# Altium schematic symbol library SCHLIB.SchLib: 2608 symbols (part 10 of 20) (continued)
## LED-WHITE-2PLCC (continued)
LED COOL WHITE DIFF 2PLCC SMD; Manufacturer: Cree; Manufacturer Part Number: CLM3C-WKW-CWBYA453; Lens Color: Yellow; Viewing Angle: 120°; Lens Style: Elliptical,Flat,Diffused,Rectangular; Forward Current: 20mA; Luminous Intensity: 1850mcd; Lens Transparency: Diffused; Luminous Flux: 4.2lm; Number of Elements: 1; Power Dissipation: 100mW; Correlated Color Temperature (CCT): 5500K; Reverse Voltage: 5V; Washability: OK; Supplier 1: Mouser; Stock 1: 33525; Pricing 1: 1=0,21000, 10=0,19600, 100=0,17900, 1000=0,16200, 2500=0,16200, 10000=0,15700 (USD); RoHS: Yes; Mount: Surface Mount; Case/Package: SMD/SMT; Number of Pins: 2; Color: White; Min Operating Temperature: -40°C; Max Operating Temperature: 100°C; Packaging: Tape and Reel; Package Quantity: 1; Illumination Color: White; Test Current: 20mA; Number of LEDs: 1; Length: 2.7mm; Height: 1.4mm; Width: 2mm; Depth: 2mm; Radiation Hardening: No; REACH SVHC: Unknown; ComponentLink1URL: https://datasheet.ciiva.com/1244/1825749-1244305.pdf?src-supplier=Element14; ComponentLink1Description: https://datasheet.ciiva.com/1244/1825749-1244305.pdf?src-supplier=Element14; ComponentLink2URL: https://datasheet.ciiva.com/2111/clm3c1076-2111265.pdf?src-supplier=Digi-Key; ComponentLink2Description: https://datasheet.ciiva.com/2111/clm3c1076-2111265.pdf?src-supplier=Digi-Key; ComponentLink3URL: https://datasheet.ciiva.com/2111/clm3c1076-2111266.pdf?src-supplier=Digi-Key; ComponentLink3Description: https://datasheet.ciiva.com/2111/clm3c1076-2111266.pdf?src-supplier=Digi-Key; ComponentLink4URL: https://datasheet.ciiva.com/2111/clm3c1076-2111267.pdf?src-supplier=Digi-Key; ComponentLink4Description: https://datasheet.ciiva.com/2111/clm3c1076-2111267.pdf?src-supplier=Digi-Key; ComponentLink5URL: https://datasheet.ciiva.com/15210/getdatasheetpartid-351108-15210359.pdf?src-supplier=Verical; ComponentLink5Description: https://datasheet.ciiva.com/15210/getdatasheetpartid-351108-15210359.pdf?src-supplier=Verical; Supplier Part Number 1: 941-CLM3CWKWCWBYA453
footprint LED-2PLCC-CLM3C-WKW/WKW
pins: A, C

## LED-WHITE-0805
designator D?, comment APTK2012RWC  Forward Voltage: 3.2V  Case/Package: 0805
LED WHITE CLEAR 0805 SMD; Manufacturer: Kingbright; Manufacturer Part Number: APTK2012RWC/Z-F01; Lens Colour: Colorless; Viewing Angle: 100°; Luminous Intensity: 700mcd; Test Current: 20mA; Washability: OK; Supplier 1: Digi-Key; Supplier Part Number 1: APTK2012RWC/Z-F01-ND; Stock 1: 0; Mount: Surface Mount; Colour: White; Package Quantity: 2000; Packaging: Tape and Reel; Lens Transparency: Clear; Length: 2mm; Height: 0.75mm; Width: 1.25mm
footprint LED-0805-WHITE
pins: A, C

## LED-WHITE-RA
designator LED?, comment Forward Voltage: 3.1V  (hidden comment: LTW-006DCG-E2)
LED WHITE SMD R/A; Manufacturer: Vishay Lite-On; Lens Color: Yellow; Viewing Angle: 110°; Luminous Intensity: 2100mcd; Test Current: 20mA; Lens Style: Colored; Forward Current: 30mA; Reverse Voltage: 5V; Number of Elements: 1; Power Dissipation: 120mW; Supplier 1: Digi-Key; Supplier Part Number 1: 160-1870-1-ND; Manufacturer Part Number: LTW-006DCG-E2; Stock: 850; Pricing: 1=0.44, 10=0.316, 100=0.2064, 500=0.1484, 1000=0.1161 (USD); RoHS: Yes; Mount: Surface Mount; Case/Package: SMD/SMT; Number of Pins: 2; Color: White; Min Operating Temperature: -30°C; Max Operating Temperature: 85°C; Packaging: Tape and Reel; Package Quantity: 1; Length: 3.8mm; Height: 0.6mm; Width: 1.2mm; Depth: 1.2mm; Lead Free: Lead Free; ComponentLink1URL: https://datasheet.ciiva.com/2116/ltw-006dcg-e2-2116066.pdf?src-supplier=Digi-Key; ComponentLink1Description: https://datasheet.ciiva.com/2116/ltw-006dcg-e2-2116066.pdf?src-supplier=Digi-Key; ComponentLink2URL: https://datasheet.ciiva.com/2116/ltw-006dcg-e2-2116067.pdf?src-supplier=Digi-Key; ComponentLink2Description: https://datasheet.ciiva.com/2116/ltw-006dcg-e2-2116067.pdf?src-supplier=Digi-Key; ComponentLink3URL: https://datasheet.ciiva.com/2116/ltw-006dcg-e2-2116065.pdf?src-supplier=Digi-Key; ComponentLink3Description: https://datasheet.ciiva.com/2116/ltw-006dcg-e2-2116065.pdf?src-supplier=Digi-Key
footprint LED-RA-2-SMD
pins: A 1, C 2

## LED-WHITE-TH-3MM
designator D?, comment RED  Forward Voltage: 2V
LED RED CLEAR 3MM ROUND T/H; Manufacturer 1: Wurth Electronics; Manufacturer Part Number 1: 151033RS03000; Luminous Intensity: 2600mcd; Viewing Angle: 30°; Lens Style: Clear,Circular,Round; Wavelength: 621nm; Test Current: 20mA; Forward Current: 30mA; Washability: OK; Supplier 1: Digi-Key; Stock 1: 20081; Pricing 1: 1=0,17000, 50=0,15700, 100=0,13400, 500=0,11500 (USD); RoHS: Yes; Mount: Through Hole; Case/Package: Radial; Color: Red; Min Operating Temperature: -40°C; Max Operating Temperature: 85°C; Package Quantity: 1; Packaging: Bulk; Dominant Wavelength: 621nm; Height: 5.55mm; Lens Size: 3mm; REACH SVHC: Unknown; ComponentLink1URL: https://datasheet.ciiva.com/22657/151033rs03000-22657026.pdf?src-supplier=Element14; ComponentLink1Description: https://datasheet.ciiva.com/22657/151033rs03000-22657026.pdf?src-supplier=Element14; ComponentLink2URL: https://datasheet.ciiva.com/29335/759472-da-01-en-tht-led-3mm-rot-151033rs03000-29335425.pdf?src-supplier=Conrad; ComponentLink2Description: https://datasheet.ciiva.com/29335/759472-da-01-en-tht-led-3mm-rot-151033rs03000-29335425.pdf?src-supplier=Conrad; ComponentLink3URL: https://datasheet.ciiva.com/48429/151033rs03000-eng-tds-48429974.pdf?src-supplier=Distrelec; ComponentLink3Description: https://datasheet.ciiva.com/48429/151033rs03000-eng-tds-48429974.pdf?src-supplier=Distrelec; Supplier Part Number 1: 732-5013-ND
footprint LED_RED_3MM
pins: A, C

## LED-WHITE-TH-5MM
designator D?, comment Forward Voltage: 3.2V  Case/Package: TH  (hidden comment: WHITE)
LED WHITE 5MM ROUND T/H; Manufacturer: Everlight; Manufacturer Part Number: 334-15/X1C5-1QSA; Lens Colour: Colorless; Lens Style: Circular,Colorless,Diffused; Viewing Angle: 50°; Luminous Intensity: 5375mcd; Test Current: 20mA; Lens Transparency: Clear; Correlated Colour Temperature (CCT): x=0.4/y=0.39; Number of LEDs: 1; Washability: OK; Supplier 1: Digi-Key; Stock 1: 6042; Pricing 1: 1=0.7, 10=0.543, 25=0.4496, 100=0.3875, 250=0.341, 500=0.2945, 1000=0.2325, 2500=0.217, 5000=0.20925 (USD); Mount: Through Hole; Number of Pins: 2; Colour: White; Packaging: Bulk; Package Quantity: 500; Height: 8.9mm; Radiation Hardening: No; ComponentLink1URL: //media.digikey.com/PDF/Data%20Sheets/Everlight%20PDFs/1246342150_6815.pdf; ComponentLink1Description: //media.digikey.com/PDF/Data%20Sheets/Everlight%20PDFs/1246342150_6815.pdf; Supplier Part Number 1: 1080-1008-ND; Supplier 2: Digi-Key; Stock 2: 21231; Pricing 2: 1=0.71, 10=0.551, 25=0.4568, 100=0.3938, 250=0.34652, 500=0.29926, 1000=0.23625, 2500=0.2205, 5000=0.21263 (USD); Supplier Part Number 2: 1080-1007-ND; Supplier 3: Digi-Key; Stock 3: 8962; Pricing 3: 1=0.22, 10=0.207, 100=0.1911, 1000=0.17092 (USD); Min Operating Temperature: -40°C; Max Operating Temperature: 95°C; Illumination Colour: White; Forward Current: 20mA; ComponentLink2URL: http://www.mouser.com/ds/2/90/C512A%20WNS%20WNN%20942-474940.pdf; ComponentLink2Description: http://www.mouser.com/ds/2/90/C512A%20WNS%20WNN%20942-474940.pdf; ComponentLink3URL: http://www.cree.com/~/media/Files/Cree/LED%20Components%20and%20Modules/HB/Data%20Sheets/C512A%20WNS%20WNN%20942.pdf; ComponentLink3Description: http://www.cree.com/~/media/Files/Cree/LED%20Components%20and%20Modules/HB/Data%20Sheets/C512A%20WNS%20WNN%20942.pdf; Supplier Part Number 3: C512A-WNN-CZ0B0152CT-ND
footprint LED_WHITE_5MM
pins: 1, 2

## LED-YELLOW-1206
designator D?, comment APT3216SYCK  Forward Voltage: 2V
LED YELLOW CLEAR CHIP SMD; Manufacturer: Kingbright; Forward Current: 20mA; Power Rating: 75mW; Luminous Intensity: 150mcd; Viewing Angle: 120°; Lens Style: Clear,Flat; Dominant Wavelength: 590nm; Number of LEDs: 1; Washability: OK; ComponentLink1URL: http://www.kingbrightusa.com/images/catalog/SPEC/APT3216SYCK.pdf; ComponentLink1Description: http://www.kingbrightusa.com/images/catalog/SPEC/APT3216SYCK.pdf; ComponentLink2URL: http://www.mouser.com/ds/2/216/APT3216SYCK-231036.pdf; ComponentLink2Description: http://www.mouser.com/ds/2/216/APT3216SYCK-231036.pdf; ComponentLink3URL: http://www.us.kingbright.com/images/catalog/SPEC/APT3216SYCK.pdf; ComponentLink3Description: http://www.us.kingbright.com/images/catalog/SPEC/APT3216SYCK.pdf; ComponentLink4URL: http://www.mouser.com/ds/2/239/Lite-On-LTST-C230KSKT-190176.pdf; ComponentLink4Description: http://www.mouser.com/ds/2/239/Lite-On-LTST-C230KSKT-190176.pdf; ComponentLink5URL: https://www.verical.com/server-webapp/html/getDatasheet?partID=102787; ComponentLink5Description: https://www.verical.com/server-webapp/html/getDatasheet?partID=102787; ComponentLink6URL: https://media.digikey.com/pdf/Data%20Sheets/Lite-On%20PDFs/LTST-C230KSKT.pdf; ComponentLink6Description: https://media.digikey.com/pdf/Data%20Sheets/Lite-On%20PDFs/LTST-C230KSKT.pdf; ComponentLink7URL: http://www1.futureelectronics.com/doc/LITE-ON/LTST-C230KSKT.pdf; ComponentLink7Description: http://www1.futureelectronics.com/doc/LITE-ON/LTST-C230KSKT.pdf; ComponentLink8URL: http://www.mouser.com/ds/2/216/APTR3216SYCK-230901.pdf; ComponentLink8Description: http://www.mouser.com/ds/2/216/APTR3216SYCK-230901.pdf; ComponentLink9URL: http://www.us.kingbright.com/images/catalog/SPEC/APTR3216SYCK.pdf; ComponentLink9Description: http://www.us.kingbright.com/images/catalog/SPEC/APTR3216SYCK.pdf; ComponentLink10URL: http://www.kingbrightusa.com/images/catalog/SPEC/APTR3216SYCK.pdf; ComponentLink10Description: http://www.kingbrightusa.com/images/catalog/SPEC/APTR3216SYCK.pdf; Supplier 1: Digi-Key; Supplier Part Number 1: 754-1144-6-ND; Stock 1: 475; Pricing 1: 1=0.48, 10=0.347, 25=0.2656, 100=0.1733, 250=0.12704, 500=0.1078, 1000=0.08855 (USD); Mount: Surface Mount; Case/Package: 1206; Number of Pins: 2; Color: Yellow; Case Code (Metric): 3216; Case Code (Imperial): 1206; Lens Color: Clear; Min Operating Temperature: -40°C; Max Operating Temperature: 85°C; Illumination Color: Yellow; Packaging: Tape and Reel; Package Quantity: 2000; Test Current: 20mA; Wavelength: 590nm; Length: 3.2mm; Height: 0.75mm; Width: 1.6mm; Lead Free: Lead Free; Manufacturer Part Number: APT3216SYCK
footprint LED-1206-YELLOW
pins: A, C

## LED-YELLOW-1206 BE
designator D?, comment LTST-C230KSKT  Forward Voltage: 2V  Case Code (Imperial): 1206 BE
LED YELLOW CLEAR CHIP SMD BOTTOM ENTRY; Manufacturer: Vishay Lite-On; Lens Colour: Clear,Colorless; Forward Current: 30mA; Power Rating: 75mW; Luminous Intensity: 60mcd; Viewing Angle: 130°; Lens Style: Clear,Colorless,Diffused,Rectangular; Dominant Wavelength: 587nm; Test Current: 20mA; Number of Elements: 1; Wavelength: 588nm; Reverse Voltage: 5V; Washability: OK; ComponentLink1URL: http://www.kingbrightusa.com/images/catalog/SPEC/APT3216SYCK.pdf; ComponentLink1Description: http://www.kingbrightusa.com/images/catalog/SPEC/APT3216SYCK.pdf; ComponentLink2URL: http://www.mouser.com/ds/2/216/APT3216SYCK-231036.pdf; ComponentLink2Description: http://www.mouser.com/ds/2/216/APT3216SYCK-231036.pdf; ComponentLink3URL: http://www.us.kingbright.com/images/catalog/SPEC/APT3216SYCK.pdf; ComponentLink3Description: http://www.us.kingbright.com/images/catalog/SPEC/APT3216SYCK.pdf; Supplier 1: Digi-Key; Supplier Part Number 1: 160-1458-6-ND; Manufacturer Part Number: LTST-C230KSKT; Stock 1: 69522; Pricing 1: 1=0.38, 10=0.281, 25=0.2072, 100=0.148, 250=0.1006, 500=0.08878, 1000=0.06954 (USD); Mount: Surface Mount; Case/Package: 1206; Number of Pins: 2; Colour: Yellow; Case Code (Metric): 3216; Min Operating Temperature: -55°C; Max Operating Temperature: 85°C; Package Quantity: 1; Illumination Colour: Yellow; Packaging: Tape and Reel; Lens Transparency: Clear; Power Dissipation: 75mW; Number of LEDs: 1; Length: 3.2mm; Height: 1.1mm; Width: 1.6mm; Depth: 1.6mm; Radiation Hardening: No; Lead Free: Lead Free; ComponentLink4URL: http://www.mouser.com/ds/2/239/Lite-On-LTST-C230KSKT-190176.pdf; ComponentLink4Description: http://www.mouser.com/ds/2/239/Lite-On-LTST-C230KSKT-190176.pdf; ComponentLink5URL: https://www.verical.com/server-webapp/html/getDatasheet?partID=102787; ComponentLink5Description: https://www.verical.com/server-webapp/html/getDatasheet?partID=102787; ComponentLink6URL: https://media.digikey.com/pdf/Data%20Sheets/Lite-On%20PDFs/LTST-C230KSKT.pdf; ComponentLink6Description: https://media.digikey.com/pdf/Data%20Sheets/Lite-On%20PDFs/LTST-C230KSKT.pdf; ComponentLink7URL: http://www1.futureelectronics.com/doc/LITE-ON/LTST-C230KSKT.pdf; ComponentLink7Description: http://www1.futureelectronics.com/doc/LITE-ON/LTST-C230KSKT.pdf; Supplier 2: Digi-Key; Supplier Part Number 2: 754-1174-6-ND; Stock 2: 110251; Pricing 2: 1=0.48, 10=0.347, 25=0.2656, 100=0.1733, 250=0.12704, 500=0.1078, 1000=0.08855 (USD); ComponentLink8URL: http://www.mouser.com/ds/2/216/APTR3216SYCK-230901.pdf; ComponentLink8Description: http://www.mouser.com/ds/2/216/APTR3216SYCK-230901.pdf; ComponentLink9URL: http://www.us.kingbright.com/images/catalog/SPEC/APTR3216SYCK.pdf; ComponentLink9Description: http://www.us.kingbright.com/images/catalog/SPEC/APTR3216SYCK.pdf; ComponentLink10URL: http://www.kingbrightusa.com/images/catalog/SPEC/APTR3216SYCK.pdf; ComponentLink10Description: http://www.kingbrightusa.com/images/catalog/SPEC/APTR3216SYCK.pdf
footprint LED-BE-1206-V1
pins: A, C

## LED-YELLOW-1206_1
designator D?, comment LTST-C150KSKT  Voltage - Forward (Vf) (Typ): 2.1V  Case Code (Imperial): 1206
LED YELLOW CLEAR 1206 SMD; Manufacturer: Vishay Lite-On; Lens Color: Clear,Colorless; Viewing Angle: 130°; Forward Voltage: 2.4V; Luminous Intensity: 60mcd; Test Current: 20mA; Dominant Wavelength: 587nm; Wavelength: 588nm; Lens Style: Clear,Colorless,Diffused,Rectangular; Forward Current: 30mA; Power Rating: 75mW; Number of Elements: 1; Reverse Voltage: 5V; Washability: OK; Supplier 1: Digi-Key; Manufacturer Part Number: LTST-C150KSKT; Stock 1: 296465; Pricing 1: 1=0.38, 10=0.281, 25=0.2072, 100=0.148, 250=0.1006, 500=0.08878, 1000=0.06954 (USD); Mount: Surface Mount; Case/Package: 1206; Number of Pins: 2; Color: Yellow; Case Code (Metric): 3216; Min Operating Temperature: -55°C; Max Operating Temperature: 85°C; Packaging: Tape and Reel; Package Quantity: 1; Lens Transparency: Clear; Illumination Color: Yellow; Power Dissipation: 75mW; Number of LEDs: 1; Length: 3.2mm; Height: 1.1mm; Width: 1.6mm; Depth: 1.6mm; Radiation Hardening: No; Lead Free: Lead Free; ComponentLink1URL: http://www.jameco.com/Jameco/Products/ProdDS/1260226.pdf?src-supplier=Jameco; ComponentLink1Description: http://www.jameco.com/Jameco/Products/ProdDS/1260226.pdf?src-supplier=Jameco; ComponentLink2URL: http://www1.futureelectronics.com/doc/LITE-ON/LTST-C150KSKT.pdf?src-supplier=Future+Electronics; ComponentLink2Description: http://www1.futureelectronics.com/doc/LITE-ON/LTST-C150KSKT.pdf?src-supplier=Future+Electronics; ComponentLink3URL: http://components.arrow.com/part/dataview/16627581S8439237N1331?src-supplier=Arrow; ComponentLink3Description: http://components.arrow.com/part/dataview/16627581S8439237N1331?src-supplier=Arrow; ComponentLink4URL: http://www.mouser.com/ds/2/239/Lite-On-LTST-C150KSKT-187236.pdf?src-supplier=Mouser; ComponentLink4Description: http://www.mouser.com/ds/2/239/Lite-On-LTST-C150KSKT-187236.pdf?src-supplier=Mouser; ComponentLink5URL: http://optoelectronics.liteon.com/upload/download/DS-22-99-0187/LTST-C150KSKT.pdf?src-supplier=Digi-Key; ComponentLink5Description: http://optoelectronics.liteon.com/upload/download/DS-22-99-0187/LTST-C150KSKT.pdf?src-supplier=Digi-Key; Supplier Part Number 1: 160-1406-6-ND
footprint LED-1206-YELLOW
pins: A, C

## MD-UG IC ETHERCAT
designator MD?, comment ETHERCAT
UNIGATE® IC - EtherCAT®; ComponentLink1Description: Datasheet; ComponentLink1URL: https://www.deutschmann.de/en/products/embedded-solutions/unigate-ic/unigate-ic-profinet/?pdf=1&id=0&bs2=0; ComponentLink2Description: Manuel; ComponentLink2URL: https://www.deutschmann.de/downloads//Marketing/Anleitung-Instructions/Handbuecher-Manuals/Gateway/English/UNIGATE%20IC/IC%20PROFINET/IC_PN2Port/IC_PN2Port_e.pdf
footprint MD-UG-IC-PIN
pins: 1 +3V3_1, 2 BE, 3 SSO0, 4 SSO1, 5 MISO, 6 MOSI, 7 SCK, 8 RESETIN, 9 +3V3_2, 10 Error-LED (A-red), 11 LED-LinkAct (Out) (C-grn)12), 12 NC_1, 13 RJ45(6_1"OUT") / RD1-, 14 RJ45(3_1"OUT") / RD1+, 15 RJ45(2_1"OUT") / TD1-, 16 RJ45(1_1"OUT") / TD1+, 17 RJ45(1_2"IN") / TD2+, 18 RJ45(2_2"IN") / TD2-, 19 RJ45(3_2"IN") / RD2+, 20 RJ45(6_2"IN") / RD2-, 21 NC_2, 22 LED-LinkAct (In) (C-grn)12), 23 Ground (PE) / nc5), 24 GND_1, 25 State-LED (A-grn) 12), 26 CONFIG MODE, 27 DBG TX, 28 DBG RX, 29 RX, 30 TX, 31 TE, 32 GND_2

## MD-UG IC PROFINET
designator MD?, comment PROFINET
UNIGATE® IC - PROFINET 2Port; ComponentLink1Description: Datasheet; ComponentLink1URL: https://www.deutschmann.de/en/products/embedded-solutions/unigate-ic/unigate-ic-profinet/?pdf=1&id=0&bs2=0; ComponentLink2Description: Manuel; ComponentLink2URL: https://www.deutschmann.de/downloads//Marketing/Anleitung-Instructions/Handbuecher-Manuals/Gateway/English/UNIGATE%20IC/IC%20PROFINET/IC_PN2Port/IC_PN2Port_e.pdf
footprint MD-UG-IC-PIN
pins: 1 +3V3_1 (in), 2 BE (in), 3 SSO1 (in), 4 SSO2 (in), 5 MISO (in), 6 MOSI (in), 7 SCK (in), 8 INReset (in), 9 +3V3_2 (in), 10 Error-LED (A-red) (in), 11 LED-LINKACT1 (C-grn) (in), 12 NC_1 (in), 13 RD1- (in), 14 RD1+ (in), 15 TD1- (in), 16 TD1+ (in), 17 TD2+ (in), 18 TD2- (in), 19 RD2+ (in), 20 RD2- (in), 21 NC_2 (in), 22 LED-LINKACT2 (C-grn) (in), 23 NC_3 (in), 24 GND_1 (in), 25 State-LED (A-grn) (in), 26 CONFIG MODE (in), 27 DBGTX (in), 28 DBGRX (in), 29 RX (in), 30 TX (in), 31 TE (in), 32 GND_2 (in)

## MDFLT-BNX024H01L
designator MD?, comment BNX024H01L
FILTER LC 4.7UF SMD; Manufacturer: Murata; Max Current Rating: 15A; Max Voltage Rating (DC): 50V; Number of Channels: 2; Attenuation Value: 35dB; ESD Protection: No; Frequency: 100kHz; Impedance: 50R; Washability: OK; Supplier 1: Arrow; Manufacturer Part Number: BNX024H01L; Stock 1: 4400; Pricing 1: 400=3,20590, 800=3,10980, 2400=2,96200, 1=6,65300, 10=5,66000, 25=4,50300, 100=4,02700, 250=3,56600 (USD); RoHS: Yes; Mount: Surface Mount; Case/Package: SMD/SMT; Min Operating Temperature: -55°C; Max Operating Temperature: 125°C; Termination: Flat; Voltage Rating: 50V; Packaging: Tape and Reel; Package Quantity: 1; Current Rating: 15A; Circuit Type: Filter; Current: 15A; Voltage Rating (DC): 50V; Length: 12.1mm; Height: 0.146inch; Width: 9.1mm; Depth: 9.1mm; Radiation Hardening: No; REACH SVHC: No SVHC; Lead Free: Lead Free; ComponentLink1URL: https://datasheet.ciiva.com/4941/murata20bnx20series-303196-4941968.pdf?src-supplier=Mouser; ComponentLink1Description: https://datasheet.ciiva.com/4941/murata20bnx20series-303196-4941968.pdf?src-supplier=Mouser; ComponentLink2URL: https://datasheet.ciiva.com/18093/getdatasheetpartid-433557-18093311.pdf?src-supplier=Verical; ComponentLink2Description: https://datasheet.ciiva.com/18093/getdatasheetpartid-433557-18093311.pdf?src-supplier=Verical; ComponentLink3URL: https://datasheet.ciiva.com/29369/l0132s0198bnx02-29369302.pdf?src-supplier=Digi-Key; ComponentLink3Description: https://datasheet.ciiva.com/29369/l0132s0198bnx02-29369302.pdf?src-supplier=Digi-Key; ComponentLink4URL: https://datasheet.ciiva.com/29369/l0132s0198bnx02-29369304.pdf?src-supplier=Digi-Key; ComponentLink4Description: https://datasheet.ciiva.com/29369/l0132s0198bnx02-29369304.pdf?src-supplier=Digi-Key; ComponentLink5URL: https://datasheet.ciiva.com/29369/l0132s0198bnx02-29369306.pdf?src-supplier=Digi-Key; ComponentLink5Description: https://datasheet.ciiva.com/29369/l0132s0198bnx02-29369306.pdf?src-supplier=Digi-Key; Supplier Part Number 1: BNX024H01L; Capacitance: 4.7uF
footprint SMD_12.10x9.10x3.7_6P
pins: 1 IN (power), 2 OUT (power), 3 RTN (power), 4 GND1 (power), 5 GND2 (power), 6 GND3 (power)

## MDPWR-CHS3002428
designator MD?, comment CHS3002428
ISOLATED DC/DC CONVERTERS 252W 1; Manufacturer: Cosel; Supplier 1: Digi-Key; Supplier Part Number 1: 1776-CHS3002428-ND; Manufacturer Part Number: CHS3002428; Stock: 30; Pricing: 1=91.81, 5=91.078, 10=90.35, 25=84.5204, 50=81.606, 100=77.5257 (USD); RoHS: No
footprint MD-DIP-CHS3002428
pins: +S, +VIN, +VOUT, -S, -VIN, -VOUT, RC, TRM
text: ISO

## MDPWR-JTD1524S12
designator MD?, comment JTD1524S12
DC DC CONVERTER 12V 15W; Manufacturer: XP Power; Washability: OK; Supplier 1: Digi-Key; Manufacturer Part Number: JTD1524S12; Stock 1: 50; Pricing 1: 1=28.00000, 5=27.16000, 10=26.32000, 25=25.20000, 100=23.52000 (USD); RoHS: No; ComponentLink1URL: http://www.farnell.com/datasheets/2259125.pdf?src-supplier=Farnell; ComponentLink1Description: http://www.farnell.com/datasheets/2259125.pdf?src-supplier=Farnell; ComponentLink2URL: https://www.xppower.com/Portals/0/pdfs/SF_JTD15.pdf?src-supplier=Digi-Key; ComponentLink2Description: https://www.xppower.com/Portals/0/pdfs/SF_JTD15.pdf?src-supplier=Digi-Key; Supplier Part Number 1: 1470-4222-ND
footprint THT_40.6 X25.4X 10.5_6P
pins: 1 VIN (power), 2 RTN (power), 3 VOUTISO (power), 4 TRIM (in), 5 GNDISO, 6 EN (in)

## MDPWR-PDQ30-Q24-S5-D
designator MD?, comment PDQ30-Q24-S5-D
DC DC CONVERTER 5V 30W; Manufacturer: CUI; Number of Outputs: 1; Min Input Voltage: 9V; Max Input Voltage: 36V; Max Output Current: 6A; Isolation Voltage: 1.5kV; Efficiency: 90%; Washability: OK; Supplier 1: Digi-Key; Manufacturer Part Number: PDQ30-Q24-S5-D; Stock 1: 35; Pricing 1: 1=34,94000, 5=34,66800, 10=34,40000, 25=33,86240, 50=32,25000, 100=29,56250, 250=29,02500 (USD); RoHS: Yes; Mount: Through Hole; Case/Package: DIP; Min Operating Temperature: -40°C; Max Operating Temperature: 105°C; Packaging: Rail/Tube; Voltage - Output 1: 5V; Max Power Dissipation: 30W; Features: UVLO,OVP,OCP,OTP,SCP; Length: 1inch; Height: 0.4inch; Width: 1inch; Lead Free: Lead Free; ComponentLink1URL: https://www.cui.com/product/resource/digikeypdf/pdq30-d.pdf?src-supplier=Digi-Key; ComponentLink1Description: https://www.cui.com/product/resource/digikeypdf/pdq30-d.pdf?src-supplier=Digi-Key; Supplier Part Number 1: 102-3891-ND
footprint SMD_25.4x24.4x10.2
pins: 1 VIN (power), 2 RTN (power), 3 EN (in), 3 VOUTISO (power), 5 GNDISO, 6 TRIM (in)

## MDPWR-S24SE05006PDFA
designator MD?, comment S24SE05006PDFA
DC DC CONVERTER 5V 30W; Manufacturer: Delta Design; Number of Outputs: 1; Efficiency: 89%; Min Input Voltage (DC): 9V; Max Input Voltage (DC): 36V; Max Output Current: 6A; Isolation Voltage: 1.6kV; Washability: OK; Supplier 1: Digi-Key; Manufacturer Part Number: S24SE05006PDFA; Stock 1: 684; Pricing 1: 1=40,59000, 5=40,27400, 10=39,95600, 25=38,68760, 50=36,78500, 100=34,24800, 250=33,74064 (USD); RoHS: Yes; Mount: Through Hole; Min Operating Temperature: -40°C; Max Operating Temperature: 85°C; Packaging: Rail/Tube; Package Quantity: 10; Min Input Voltage: 9V; Max Input Voltage: 36V; Voltage - Output 1: 5V; Max Power Dissipation: 30W; Features: UVLO; Length: 1inch; Height: 0.4inch; Width: 1inch; ComponentLink1URL: http://www.produktinfo.conrad.com/datenblaetter/1300000-1399999/001312204-da-01-en-DC_DC_WANDLER_S24SE05006PDFA_DELTA.pdf?src-supplier=Conrad; ComponentLink1Description: http://www.produktinfo.conrad.com/datenblaetter/1300000-1399999/001312204-da-01-en-DC_DC_WANDLER_S24SE05006PDFA_DELTA.pdf?src-supplier=Conrad; ComponentLink2URL: http://www.deltaww.com/filecenter/products/download/01/0102/datasheet/DS_S24SE_S24DE_30W.pdf?src-supplier=Digi-Key; ComponentLink2Description: http://www.deltaww.com/filecenter/products/download/01/0102/datasheet/DS_S24SE_S24DE_30W.pdf?src-supplier=Digi-Key; Supplier Part Number 1: 941-1630-ND
footprint SMD_25.4x24.4x10.2
pins: 1 VIN (power), 2 RTN (power), 3 EN (in), 4 GNDISO, 5 TRIM (in), 6 VOUTISO (power)

## MDPWR-S24SP24002PDFA
designator MD?, comment S24SP24002PDFA  Max Output Current: 1.7A
DC/DC CONVERTER 24V 40W; Manufacturer: Delta Design; Number of Outputs: 1; Min Input Voltage: 9V; Max Input Voltage: 36V; Isolation Voltage: 1.5kV; Efficiency: 92.5%; Washability: OK; Supplier 1: Digi-Key; Manufacturer Part Number: S24SP24002PDFA; Stock 1: 200; Pricing 1: 1=47.74000, 5=47.37000, 10=46.99700, 25=45.50480, 50=43.26660, 100=40.28280, 250=39.68600 (USD); RoHS: Yes; Mount: Through Hole; Min Operating Temperature: -40°C; Max Operating Temperature: 85°C; Packaging: Bulk; Voltage - Output 1: 24V; Max Power Dissipation: 40W; Features: OVP,OCP,OTP,SCP; Length: 2inch; Height: 0.41inch; Width: 1inch; ComponentLink1URL: http://www.deltaww.com/fileCenter/products/download/01/0102/datasheet/DS_S24SP24002.pdf?src-supplier=Digi-Key; ComponentLink1Description: http://www.deltaww.com/fileCenter/products/download/01/0102/datasheet/DS_S24SP24002.pdf?src-supplier=Digi-Key; Supplier Part Number 1: 941-1757-ND; Stock: 2004; Pricing: 1=0.45, 10=0.32, 50=0.2422, 100=0.2109, 500=0.1562, 1000=0.1328 (USD); ComponentLink2URL: http://www.farnell.com/datasheets/2741232.pdf?src-supplier=Farnell; ComponentLink2Description: http://www.farnell.com/datasheets/2741232.pdf?src-supplier=Farnell
footprint THT_50.8x25.4x10.5_6P
pins: 1 VIN (power), 2 RTN (power), 3 EN (in), 4 TRIM (in), 5 GNDISO, 6 VOUTISO (power)

## MDPWR-SPBW06F-05
designator MD?, comment SPBW06F-05
DC DC CONVERTER 5V 6W; Manufacturer: Mean Well; Supplier 1: Digi-Key; Supplier Part Number 1: 1866-4810-ND; Manufacturer Part Number: SPBW06F-05; Stock: 800; Pricing: 1=9.99, 10=9.839, 25=9.6876, 50=9.3848, 100=8.4766, 250=8.3252, 500=8.1739 (USD); RoHS: No; ComponentLink1URL: https://media.digikey.com/pdf/Data%20Sheets/Mean%20Well%20PDF's/SPBW06,DPBW06_Ds.pdf?src-supplier=Digi-Key; ComponentLink1Description: https://media.digikey.com/pdf/Data%20Sheets/Mean%20Well%20PDF's/SPBW06,DPBW06_Ds.pdf?src-supplier=Digi-Key
footprint MD- SPBW06
pins: 1 -VIN, 2 +VIN, 3 RC, 5 NC1, 6 +VOUT, 7 -VOUT, 8 NC2
text: ISO

## MDPWR-THN30-2415
designator MD?, comment THN30-2415
DC-DC 24VIN 1-OUT 24V 1.25A 30W 6-Pin; Manufacturer: Traco Power; Number of Outputs: 1; Efficiency: 91%; Max Input Voltage: 36V; Min Input Voltage: 18V; Isolation: Isolated; Isolation Voltage: 1.5kV; Supplier 1: RSComponents; Manufacturer Part Number: THN30-2415; Stock 1: 12; Pricing 1: 1=71,35700, 5=69,21200, 10=67,08000, 25=64,22000, 50=61,37300, 1=548,90000, 5=532,40000, 10=516,00000, 25=494,00000, 50=472,10000 (EUR); RoHS: Yes; Mount: Through Hole; Case/Package: Module; Number of Pins: 6; Weight: 16.5g; Min Operating Temperature: -40°C; Max Operating Temperature: 85°C; Output Voltage: 24V; Output Current: 1.25A; Nominal Output Voltage: 24V; Max Output Current: 1.25A; Max Output Power: 30W; Voltage - Output 1: 24V; Current - Output 1: 1.25A; Max Input Voltage (DC): 36V; Min Input Voltage (DC): 18V; Nominal Input Voltage: 24V; Length: 25.4mm; Height: 9.9mm; Width: 25.4mm; Depth: 25.4mm; REACH SVHC: No SVHC; ComponentLink1URL: https://datasheet.ciiva.com/41865/1718367-41865680.pdf?src-supplier=Newark; ComponentLink1Description: https://datasheet.ciiva.com/41865/1718367-41865680.pdf?src-supplier=Newark; ComponentLink2URL: https://datasheet.ciiva.com/30487/0900766b81210713-30487603.pdf?src-supplier=RSComponents; ComponentLink2Description: https://datasheet.ciiva.com/30487/0900766b81210713-30487603.pdf?src-supplier=RSComponents; ComponentLink3URL: https://datasheet.ciiva.com/46416/1763638-46416055.pdf?src-supplier=Element14; ComponentLink3Description: https://datasheet.ciiva.com/46416/1763638-46416055.pdf?src-supplier=Element14; Supplier Part Number 1: 7813373
footprint SMD_25.4x25.4x9.9 (THN 30-2415)
pins: 1 +Vin (Vcc) (power), 2 –Vin (GND) (power), 3 +Vout, 4 Trim, 5 –Vout, 6 Remote On/Off (power)

## MECH-2.4MM HOLE
designator MECH?, comment 2.4MM  (no BOM)
Washability: OK
footprint MECH-2.4MM HOLE
pins: 1

## MECH-2MM HOLE
designator MH?, comment 2MM  (no BOM)
Washability: OK
footprint MECH-2MM
pins: 1

## MECH-3.2MM HOLE
designator MECH?, comment 3.2MM  (no BOM)
Washability: OK
footprint MECH-3.2MM HOLE
pins: 1

## MECH-3MM HOLE
designator MECH?, comment 3MM  (no BOM)
Washability: OK
footprint MECH-3MM HOLE
pins: 1

## MECH-AFY320240A0
designator MECH?, comment AFY320240A0
IPS 3.5" 320240 SPI+24BIT RGB; Manufacturer Part Number: AFY320240A0-3.5INTH; ComponentLink1Description: Datasheet; ComponentLink1URL: https://www.orientdisplay.com/wp-content/uploads/2019/12/AFY320240A0-3.5INTH-spec.pdf
footprint MECH-AFY320240A0

## MECH-BOX
designator MECH?  (value not drawn)  (no BOM)
BOX BOX BOX; Washability: OK
footprint MECH-HEMSIRE PANELI
text: BOX

## MECH-CAP-AKTSC22K
designator MECH?, comment CAP  (mechanical)
CAP TACTILE ROUND BLACK; Manufacturer: APEM; Manufacturer Part Number: KTSC-22K; Illumination Type: Non-Illuminated; Supplier 1: Digi-Key; Supplier Part Number 1: 679-2315-ND; Stock: 16244; Pricing: 1=0.23, 10=0.216, 25=0.2116, 50=0.207, 100=0.2025, 250=0.1935, 500=0.189, 1000=0.144, 5000=0.135 (USD); RoHS: Yes; Color: Black; Shape: Round; Min Operating Temperature: -25°C; Max Operating Temperature: 70°C; Package Quantity: 100; Height: 5.7mm; ComponentLink1URL: https://datasheet.ciiva.com/12445/adts6-adtsm-ktsc6-263747-12445134.pdf?src-supplier=Mouser; ComponentLink1Description: https://datasheet.ciiva.com/12445/adts6-adtsm-ktsc6-263747-12445134.pdf?src-supplier=Mouser; ComponentLink2URL: https://datasheet.ciiva.com/16171/adts6-adtsm-ktsc6-16171454.pdf?src-supplier=Onlinecomponents.com; ComponentLink2Description: https://datasheet.ciiva.com/16171/adts6-adtsm-ktsc6-16171454.pdf?src-supplier=Onlinecomponents.com

## MECH-ESD-LOGO
designator MECH?  (value not drawn)  (no BOM)
Washability: OK
footprint ESD-LOGO-2
footprint ESD_LOGO_4
footprint ESD_LOGO_5
text: ESD LOGO

## MECH-EVE3-35A-BLM-TPN-F32
designator MECH?, comment 3.5"
3.5" 320X240 PIXEL NON-TOUCH SPI; Manufacturer: Matrix Orbital; Manufacturer Part Number: EVE3-35A-BLM-TPN-F32; Supplier 1: Digi-Key; Supplier Part Number 1: 635-EVE3-35A-BLM-TPN-F32-ND; Stock: 96; Pricing: 1=46.71, 25=45.6004, 50=44.52, 100=42.8701, 200=42.1903 (USD)
footprint MECH-AFY320240A0

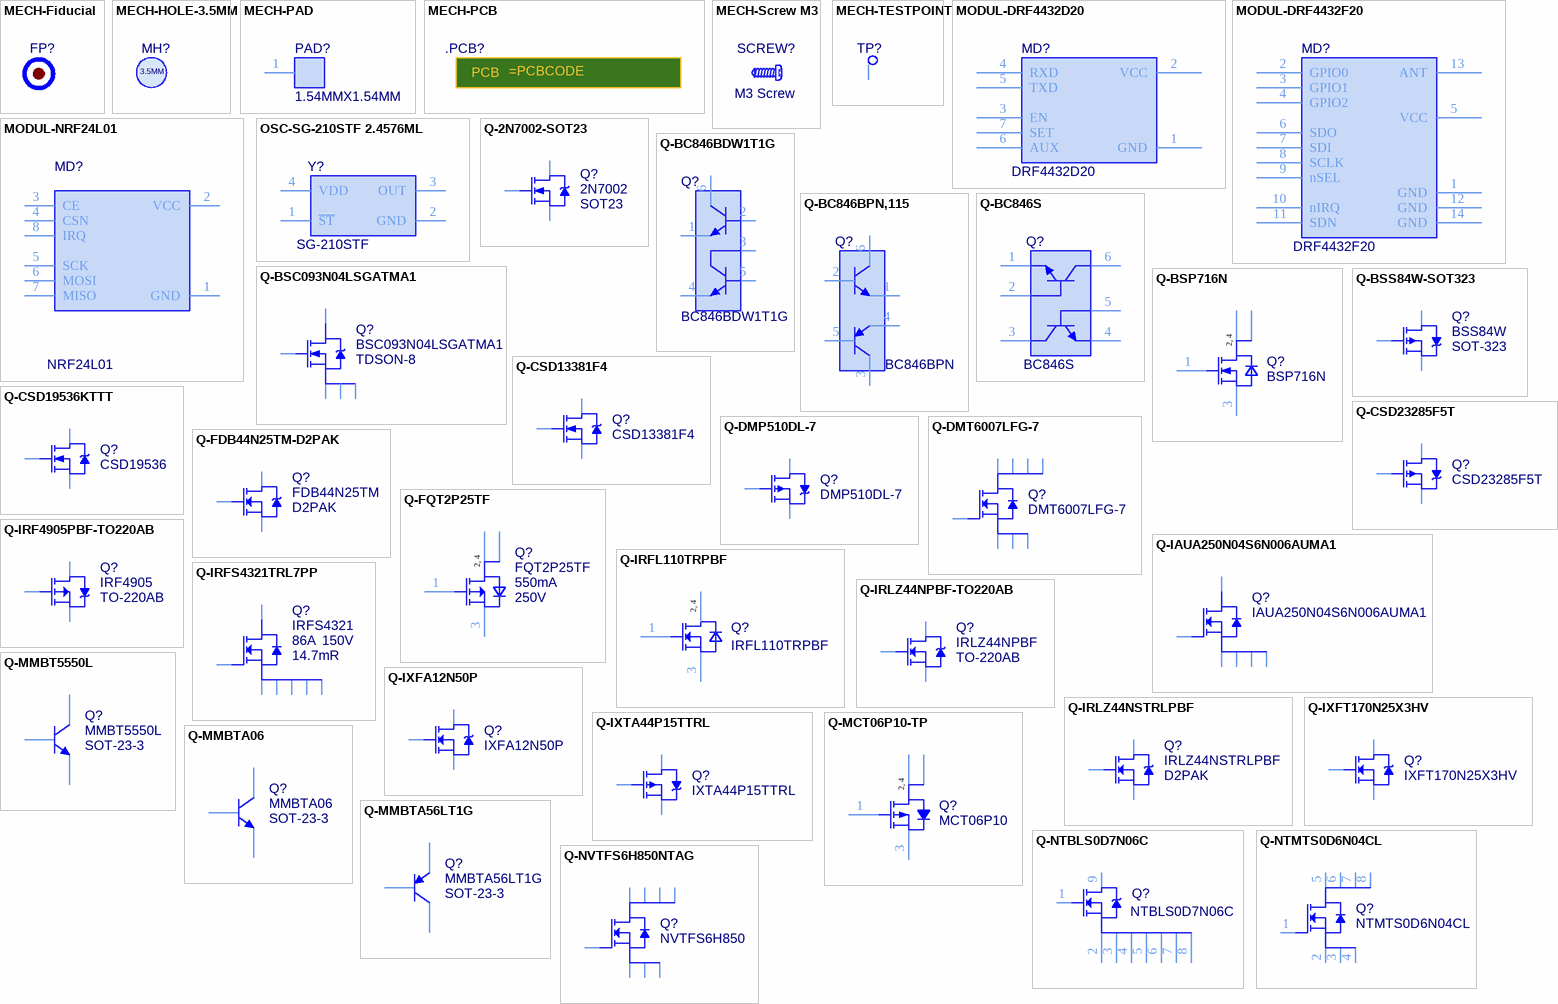
[diagram p42: symbols MECH-Fiducial to Q-NVTFS6H850NTAG]

## MECH-Fiducial
designator FP?  (value not drawn)  (no BOM)
Washability: OK
footprint MECH-Fiducial

## MECH-HOLE-3.5MM
designator MH?, comment 3.5MM  (no BOM)
Washability: OK
footprint MECH-3.5MM

## MECH-PAD
designator PAD?, comment 1.54MMX1.54MM  (no BOM)
Washability: OK
footprint MECH-PAD
pins: 1

## MECH-PCB
designator .PCB?, comment PCB
Washability: OK; Manufacturer Part Number: =PCBCODE
footprint MECH-PCBCODE

## MECH-Screw M3
designator SCREW?, comment M3 Screw  (no BOM)
Screw; Washability: OK
footprint MECH-SCREW M3 (YSB)

## MECH-TESTPOINT
designator TP?  (value not drawn)  (no BOM)
Washability: OK
pins: 1

## MODUL-DRF4432D20
designator MD?, comment DRF4432D20
20dBm ISM RF Tranvceiver Module; Washability: OK
footprint MOD-DRF4432D20
pins: 1 GND, 2 VCC, 3 EN, 4 RXD, 5 TXD, 6 AUX, 7 SET

## MODUL-DRF4432F20
designator MD?, comment DRF4432F20
20dBm ISM RF Tranvceiver Module; Washability: OK
footprint MOD-DRF4432F20
pins: 1 GND, 2 GPIO0, 3 GPIO1, 4 GPIO2, 5 VCC, 6 SDO, 7 SDI, 8 SCLK, 9 nSEL, 10 nIRQ, 11 SDN, 12 GND, 13 ANT, 14 GND

## MODUL-NRF24L01
designator MD?, comment NRF24L01
2.4GHz Wireless Transceiver Module; Manufacturer Part Number: NRF24L01 + PA + LNA; Washability: OK
footprint MOD-NRF24L01
pins: 1 GND, 2 VCC, 3 CE, 4 CSN, 5 SCK, 6 MOSI, 7 MISO, 8 IRQ

## OSC-SG-210STF 2.4576ML
designator Y?, comment SG-210STF
XTAL OSC XO 2.4576MHZ CMOS SMD; Manufacturer: Epson; Manufacturer Part Number: SG-210STF 2.4576ML; Max Supply Current: 1.8mA; Frequency Stability: 50ppm; Supplier 1: Digi-Key; Supplier Part Number 1: SER3866-ND; Stock: 214; Pricing: 1=1.22, 10=1.081, 50=1.0106, 100=0.893 (USD); RoHS: Yes; Mount: Surface Mount; Case/Package: SMD/SMT; Min Operating Temperature: -40°C; Max Operating Temperature: 85°C; Frequency: 2.4576MHz; Packaging: Cut Strip; Length: 0.098inch; Height: 0.035inch; Width: 0.079inch; ComponentLink1URL: https://datasheet.ciiva.com/29629/029-sg-210stf-e147-29629205.pdf?src-supplier=Digi-Key; ComponentLink1Description: https://datasheet.ciiva.com/29629/029-sg-210stf-e147-29629205.pdf?src-supplier=Digi-Key
footprint CRYSTAL-2.5X2
pins: 1 ~{ST}, 2 GND, 3 OUT, 4 VDD

## Q-2N7002-SOT23
designator Q?, comment 2N7002  Case/Package: SOT23
MOSFET N-CH 60V 0.115A SOT-23; Manufacturer: Diodes; Manufacturer Part Number: 2N7002-HT; Continuous Drain Current (ID): 115mA; Rise Time: 3ns; Nominal Vgs: 2.5V; Max Power Dissipation: 300mW; Gate to Source Voltage (Vgs): 20V; Fall Time: 5.6ns; Turn-Off Delay Time: 11ns; Turn-On Delay Time: 7ns; Rds On Max: 7.5R; Input Capacitance: 50pF; Number of Elements: 1; Drain to Source Breakdown Voltage: 70V; Power Dissipation: 540mW; Element Configuration: Single; Current: 115A; Washability: OK; Stock 1: 71613; Pricing 1: 1=0.22, 10=0.199, 100=0.1305, 500=0.0638, 1000=0.04349 (USD); Mount: Surface Mount; Number of Pins: 3; Weight: 0.000282oz; Contact Plating: Matte,Tin; Min Operating Temperature: -55°C; Max Operating Temperature: 150°C; Drain to Source Voltage (Vdss): 60V; Packaging: Tape and Reel; Package Quantity: 3000; Dual Supply Voltage: 60V; Number of Channels: 1; Drain to Source Resistance: 7.5R; On-State Resistance: 7.5R; Threshold Voltage: 2.5V; Termination: SMD/SMT; Voltage Rating (DC): 60V; Current Rating: 115mA; Voltage: 60V; Length: 2.9mm; Height: 1mm; Width: 1.3mm; Radiation Hardening: No; REACH SVHC: No SVHC; Lead Free: Lead Free; ComponentLink1URL: http://www.diodes.com/datasheets/ds11303.pdf; ComponentLink1Description: http://www.diodes.com/datasheets/ds11303.pdf; ComponentLink2URL: https://www.verical.com/server-webapp/html/getDatasheet?partID=110059; ComponentLink2Description: https://www.verical.com/server-webapp/html/getDatasheet?partID=110059; ComponentLink3URL: http://www.alliedelec.com/images/products/datasheets/bm/DIODES%20INC/70437206.pdf; ComponentLink3Description: http://www.alliedelec.com/images/products/datasheets/bm/DIODES%20INC/70437206.pdf; ComponentLink4URL: http://www.farnell.com/datasheets/1915452.pdf; ComponentLink4Description: http://www.farnell.com/datasheets/1915452.pdf; ComponentLink5URL: http://www.farnell.com/datasheets/2096661.pdf; ComponentLink5Description: http://www.farnell.com/datasheets/2096661.pdf; Supplier 1: ÖZDİSAN; Supplier Part Number: 2N7002-HT; Supplier 2: Digi-Key; Stock 2: 71613; Pricing 2: 1=0.22, 10=0.199, 100=0.1305, 500=0.0638, 1000=0.04349 (USD); Supplier Part Number 2: 2N7002-FDIDKR-ND; Supplier 3: Digi-Key; Stock 3: 0; Pricing 3: 1=0.25, 10=0.227, 100=0.1269, 500=0.06798, 1000=0.04623 (USD); Supplier Part Number 3: 1727-2764-6-ND; Supplier 4: Digi-Key; Stock 4: 0; Pricing 4: 1=0.28, 10=0.252, 100=0.1411, 500=0.07562, 1000=0.05142 (USD); Halogen Free: Halogen Free; ComponentLink6URL: http://www.onsemi.com/pub/Collateral/2N7002L-D.PDF; ComponentLink6Description: http://www.onsemi.com/pub/Collateral/2N7002L-D.PDF; ComponentLink7URL: http://www.farnell.com/datasheets/1747988.pdf; ComponentLink7Description: http://www.farnell.com/datasheets/1747988.pdf; ComponentLink8URL: http://www.farnell.com/datasheets/2354034.pdf; ComponentLink8Description: http://www.farnell.com/datasheets/2354034.pdf; ComponentLink9URL: http://www.onsemi.com/pub_link/Collateral/2N7002L-D.PDF; ComponentLink9Description: http://www.onsemi.com/pub_link/Collateral/2N7002L-D.PDF; Supplier Part Number 4: 2N7002LT1GOSDKR-ND; Supplier 5: Digi-Key; Stock 5: 708565; Pricing 5: 1=0.26, 10=0.237, 100=0.1324, 500=0.07096, 1000=0.04825 (USD); Supplier Part Number 5: 2N7002K-T1-E3DKR-ND
footprint Model Name (Model Description)
footprint SOT23-3
pins: 1 G, 2 S, 3 D

## Q-BC846BDW1T1G
designator Q?, comment BC846BDW1T1G
TRANS 2NPN 65V 0.1A SOT363; Manufacturer: On Semiconductor; IC Continuous (A): 0.1; fT Min (MHz): 100; Polarity: Dual NPN; Packing: Tape and Reel; Max Power Dissipation: 380mW; Max Collector Current: 100mA; Collector Base Voltage (VCBO): 80V; Frequency: 100MHz; Number of Elements: 2; hFE Min: 200; Emitter Base Voltage (VEBO): 6V; Collector Emitter Saturation Voltage: 600mV; Element Configuration: Dual; Washability: OK; PartNumber: BC846BDW1T1G; ComponentLink3Description: Package Specification; PackageVersion: Rev. W, 01/2006; ComponentLink2URL: http://www.onsemi.cn/pub_link/Collateral/BC846BDW1T1-D.PDF; PackageDescription: 6-Pin Small Outline Transistor, Body 2 x 1.25 mm, Pitch 0.65 mm; ComponentLink2Description: Datasheet; PackageReference: SOT-363-6-419B-02_W; RoHS: TRUE; ComponentLink3URL: http://www.onsemi.com/pub_link/Collateral/NTJD4001N-D.PDF; DatasheetVersion: Rev. 9; ComponentLink1Description: Manufacturer URL; Mounting Technology: Surface Mount; ComponentLink1URL: http://www.onsemi.com/; Supplier 1: Digi-Key; Supplier Part Number 1: BC846BDW1T1GOSCT-ND; Manufacturer Part Number: BC846BDW1T1G; Stock 1: 194412; Pricing 1: 1=0.20000, 10=0.16300, 100=0.06660, 500=0.05556, 1000=0.03861 (USD); Case/Package: SOT-363-6; Number of Pins: 6; Contact Plating: Tin,Matte; Min Operating Temperature: -55°C; Max Operating Temperature: 150°C; Collector Emitter Voltage (VCEO): 65V; Package Quantity: 1; Packaging: Tape and Reel; Transition Frequency: 100MHz; Collector Emitter Breakdown Voltage: 65V; Max Breakdown Voltage: 65V; Power Dissipation: 380mW; Gain Bandwidth Product: 100MHz; Max Frequency: 100MHz; Voltage Rating (DC): 65V; Current Rating: 100mA; Length: 2mm; Height: 0.9mm; Width: 1.25mm; Radiation Hardening: No; REACH SVHC: No SVHC; Lead Free: Lead Free; Halogen Free: Halogen Free; ComponentLink4URL: https://datasheet.ciiva.com/968/bc846bdw1t1-d-968800.pdf?src-supplier=Digi-Key; ComponentLink4Description: https://datasheet.ciiva.com/968/bc846bdw1t1-d-968800.pdf?src-supplier=Digi-Key; ComponentLink5URL: https://datasheet.ciiva.com/17064/0900766b80dabb08-17064908.pdf?src-supplier=Allied+Electronics; ComponentLink5Description: https://datasheet.ciiva.com/17064/0900766b80dabb08-17064908.pdf?src-supplier=Allied+Electronics; ComponentLink6URL: https://datasheet.ciiva.com/15138/getdatasheetpartid-53817-15138804.pdf?src-supplier=Verical; ComponentLink6Description: https://datasheet.ciiva.com/15138/getdatasheetpartid-53817-15138804.pdf?src-supplier=Verical; ComponentLink7URL: https://datasheet.ciiva.com/968/bc846bdw1t1-d-968801.pdf?src-supplier=Digi-Key; ComponentLink7Description: https://datasheet.ciiva.com/968/bc846bdw1t1-d-968801.pdf?src-supplier=Digi-Key; ComponentLink8URL: https://datasheet.ciiva.com/1193/bc846bdw1t1-d-1193751.pdf?src-supplier=Element14; ComponentLink8Description: https://datasheet.ciiva.com/1193/bc846bdw1t1-d-1193751.pdf?src-supplier=Element14; ComponentLink9URL: https://datasheet.ciiva.com/968/bc846bdw1t1-d-968799.pdf?src-supplier=Digi-Key; ComponentLink9Description: https://datasheet.ciiva.com/968/bc846bdw1t1-d-968799.pdf?src-supplier=Digi-Key; ComponentLink10URL: https://datasheet.ciiva.com/11197/bc846bdw1t1-d-11197781.pdf?src-supplier=Avnet; ComponentLink10Description: https://datasheet.ciiva.com/11197/bc846bdw1t1-d-11197781.pdf?src-supplier=Avnet; ComponentLink11URL: https://datasheet.ciiva.com/22653/1708249-22653899.pdf?src-supplier=Element14; ComponentLink11Description: https://datasheet.ciiva.com/22653/1708249-22653899.pdf?src-supplier=Element14; ComponentLink12URL: https://datasheet.ciiva.com/16418/bc846bdw1t1-d-16418524.pdf?src-supplier=Future+Electronics; ComponentLink12Description: https://datasheet.ciiva.com/16418/bc846bdw1t1-d-16418524.pdf?src-supplier=Future+Electronics; ComponentLink13URL: https://datasheet.ciiva.com/43505/2012179-43505580.pdf?src-supplier=Jameco; ComponentLink13Description: https://datasheet.ciiva.com/43505/2012179-43505580.pdf?src-supplier=Jameco
footprint TSSOP6(SOT363)
pins: 1 E, 2 B, 3 C, 4 E, 5 B, 6 C